# Altium footprint library MyLib.PcbLib: 575 footprints (part 5 of 36)
Each footprint in its own frame and in the unit in brackets; x right, y up, seen from the top. Pads: shape width x height; smd on the part's side, far side on the other; paste and mask are expansions set on the pad; w line width, h text height; cw(c..) or ccw(c..) is an arc to the next point about the centre after c.
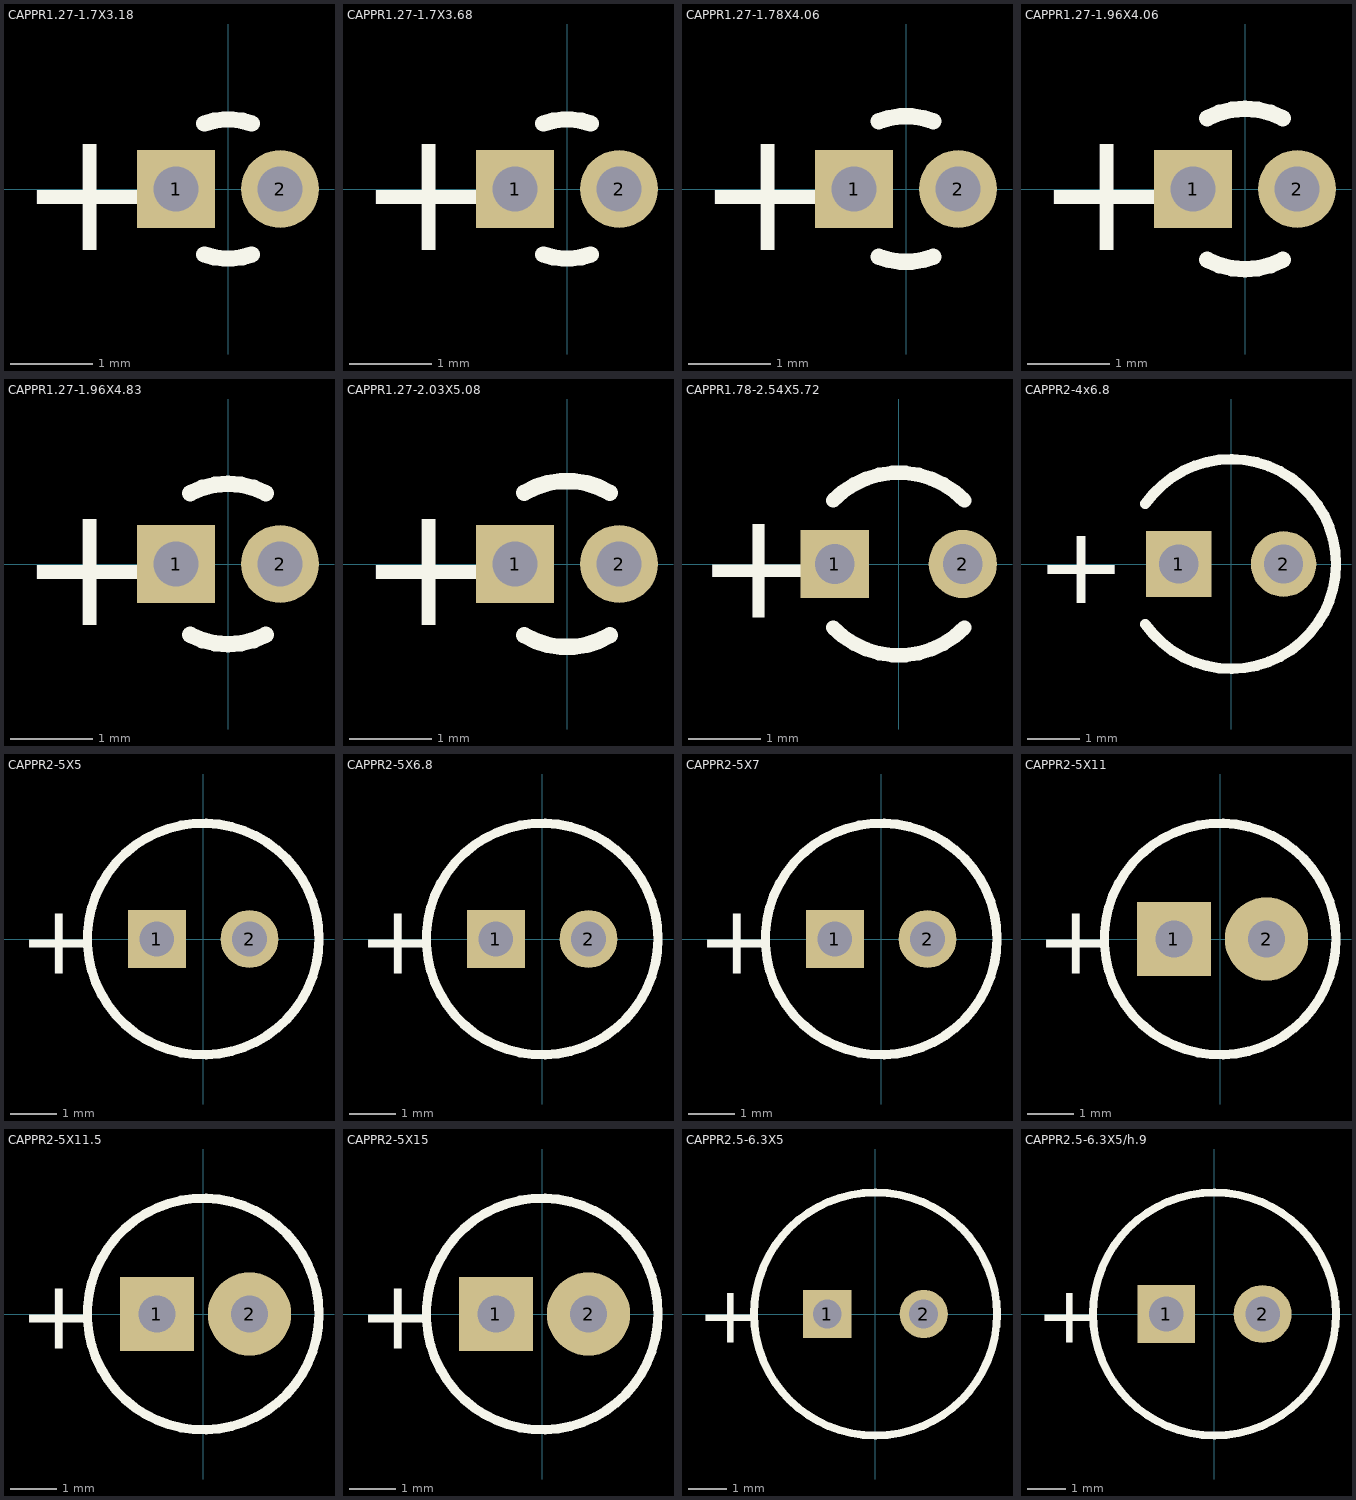
[diagram p4: the footprints below, top view; thin cyan lines are the x and y axes]

## CAPPR1.27-1.7X3.18 [mm]
pads (2):
  rect 0.95x0.95 hole 0.55: 1(-0.635,0)
  round 0.95 hole 0.55: 2(0.635,0)
Top Overlay:
  lines w0.2: -0.291,-0.799 ccw(c0,0) 0.291,-0.799 ; -0.291,0.799 cw(c0,0) 0.291,0.799
  text "+" at -2.551,-0.749 h1.5
3D body: height 3.18, standoff 0, extent -0.898,-0.898 0.898,0.898

## CAPPR1.27-1.7X3.68 [mm]
pads (2):
  rect 0.95x0.95 hole 0.55: 1(-0.635,0)
  round 0.95 hole 0.55: 2(0.635,0)
Top Overlay:
  lines w0.2: -0.291,-0.799 ccw(c0,0) 0.291,-0.799 ; -0.291,0.799 cw(c0,0) 0.291,0.799
  text "+" at -2.551,-0.749 h1.5
3D body: height 3.68, standoff 0, extent -0.898,-0.898 0.898,0.898

## CAPPR1.27-1.78X4.06 [mm]
pads (2):
  rect 0.95x0.95 hole 0.55: 1(-0.635,0)
  round 0.95 hole 0.55: 2(0.635,0)
Top Overlay:
  lines w0.2: -0.333,-0.825 ccw(c0,0) 0.333,-0.825 ; -0.333,0.825 cw(c0,0) 0.333,0.825
  text "+" at -2.551,-0.749 h1.5
3D body: height 4.06, standoff 0, extent -0.898,-0.898 0.898,0.898

## CAPPR1.27-1.96X4.06 [mm]
pads (2):
  rect 0.95x0.95 hole 0.55: 1(-0.635,0)
  round 0.95 hole 0.55: 2(0.635,0)
Top Overlay:
  lines w0.2: -0.46,-0.865 ccw(c0,0) 0.46,-0.865 ; -0.46,0.865 cw(c0,0) 0.46,0.865
  text "+" at -2.551,-0.749 h1.5
3D body: height 4.06, standoff 0.2, extent -1.023,-1.023 1.023,1.023

## CAPPR1.27-1.96X4.83 [mm]
pads (2):
  rect 0.95x0.95 hole 0.55: 1(-0.635,0)
  round 0.95 hole 0.55: 2(0.635,0)
Top Overlay:
  lines w0.2: -0.46,-0.865 ccw(c0,0) 0.46,-0.865 ; -0.46,0.865 cw(c0,0) 0.46,0.865
  text "+" at -2.551,-0.749 h1.5
3D body: height 4.83, standoff 0.2, extent -1.023,-1.023 1.023,1.023

## CAPPR1.27-2.03X5.08 [mm]
pads (2):
  rect 0.95x0.95 hole 0.55: 1(-0.635,0)
  round 0.95 hole 0.55: 2(0.635,0)
Top Overlay:
  lines w0.2: -0.523,-0.87 ccw(c0,0) 0.523,-0.87 ; -0.523,0.87 cw(c0,0) 0.523,0.87
  text "+" at -2.551,-0.749 h1.5
3D body: height 5.08, standoff 0.2, extent -1.092,-1.092 1.092,1.092

## CAPPR1.78-2.54X5.72 [mm]
pads (2):
  rect 0.95x0.95 hole 0.55: 1(-0.89,0)
  round 0.95 hole 0.55: 2(0.89,0)
Top Overlay:
  lines w0.2: -0.914,-0.882 ccw(c0,0) 0.914,-0.882 ; -0.914,0.882 cw(c0,0) 0.914,0.882
  text "+" at -2.806,-0.749 h1.5
3D body: height 5.72, standoff 0.2, extent -1.269,-1.269 1.269,1.269
3D body "Pin.STEP": height 3, standoff -2, extent -1.636,-0.746 -0.144,0.746
3D body "Pin.STEP": height 3, standoff -2, extent 0.144,-0.746 1.636,0.746

## CAPPR2-4x6.8 [mm]
pads (2):
  rect 1.25x1.25 hole 0.75: 1(-1,0)
  round 1.25 hole 0.75: 2(1,0)
Top Overlay:
  lines w0.2: -1.638,-1.147 ccw(c0,0) 2,0 ccw(c0,0) -1.638,1.147
  text "+" at -3.725,-0.75 h1.5
3D body: height 6.8, standoff 0.2, extent -1.983,-1.983 1.983,1.983

## CAPPR2-5X5 [mm]
pads (2):
  rect 1.25x1.25 hole 0.75: 1(-1,0)
  round 1.25 hole 0.75: 2(1,0)
Top Overlay:
  circle w0.2: c0,0 r2.5
  text "+" at -3.975,-0.75 h1.5
3D body: height 5, standoff -2, extent -2.5,-2.499 2.5,2.499

## CAPPR2-5X6.8 [mm]
pads (2):
  rect 1.25x1.25 hole 0.75: 1(-1,0)
  round 1.25 hole 0.75: 2(1,0)
Top Overlay:
  circle w0.2: c0,0 r2.5
  text "+" at -3.975,-0.75 h1.5
3D body: height 6.8, standoff -2, extent -2.5,-2.498 2.5,2.499

## CAPPR2-5X7 [mm]
pads (2):
  rect 1.25x1.25 hole 0.75: 1(-1,0)
  round 1.25 hole 0.75: 2(1,0)
Top Overlay:
  circle w0.2: c0,0 r2.5
  text "+" at -3.975,-0.75 h1.5
3D body: height 7, standoff -2, extent -2.5,-2.498 2.5,2.499

## CAPPR2-5X11 [mm]
pads (2):
  rect 1.6x1.6 hole 0.8: 1(-1,0)
  round 1.8 hole 0.8: 2(1,0)
Top Overlay:
  circle w0.2: c0,0 r2.5
  text "+" at -3.975,-0.75 h1.5
3D body: height 11, standoff -2, extent -2.5,-2.498 2.5,2.499

## CAPPR2-5X11.5 [mm]
pads (2):
  rect 1.6x1.6 hole 0.8: 1(-1,0)
  round 1.8 hole 0.8: 2(1,0)
Top Overlay:
  circle w0.2: c0,0 r2.5
  text "+" at -3.975,-0.75 h1.5
3D body: height 11.5, standoff -2, extent -2.5,-2.498 2.5,2.499

## CAPPR2-5X15 [mm]
pads (2):
  rect 1.6x1.6 hole 0.8: 1(-1,0)
  round 1.8 hole 0.8: 2(1,0)
Top Overlay:
  circle w0.2: c0,0 r2.5
  text "+" at -3.975,-0.75 h1.5
3D body: height 15, standoff -2, extent -2.5,-2.498 2.5,2.499

## CAPPR2.5-6.3X5 [mm]
pads (2):
  rect 1.25x1.25 hole 0.75: 1(-1.25,0)
  round 1.25 hole 0.75: 2(1.25,0)
Top Overlay:
  circle w0.2: c0,0 r3.15
  text "+" at -4.625,-0.75 h1.5
3D body: height 5, standoff -2, extent -3.15,-3.145 3.15,3.145

## CAPPR2.5-6.3X5/h.9 [mm]
pads (2):
  rect 1.5x1.5 hole 0.9: 1(-1.25,0)
  round 1.5 hole 0.9: 2(1.25,0)
Top Overlay:
  circle w0.2: c0,0 r3.15
  text "+" at -4.625,-0.75 h1.5
3D body "CAPR-2.5-6.3-5.STEP": height 1.5, standoff -5.5, extent -3.15,-3.145 3.15,3.145